# Altium footprint library LDCN Components.PcbLib: 426 footprints (part 24 of 27)
Each footprint in its own frame and in the unit in brackets; x right, y up, seen from the top. Pads: shape width x height; smd on the part's side, far side on the other; paste and mask are expansions set on the pad; w line width, h text height; cw(c..) or ccw(c..) is an arc to the next point about the centre after c.
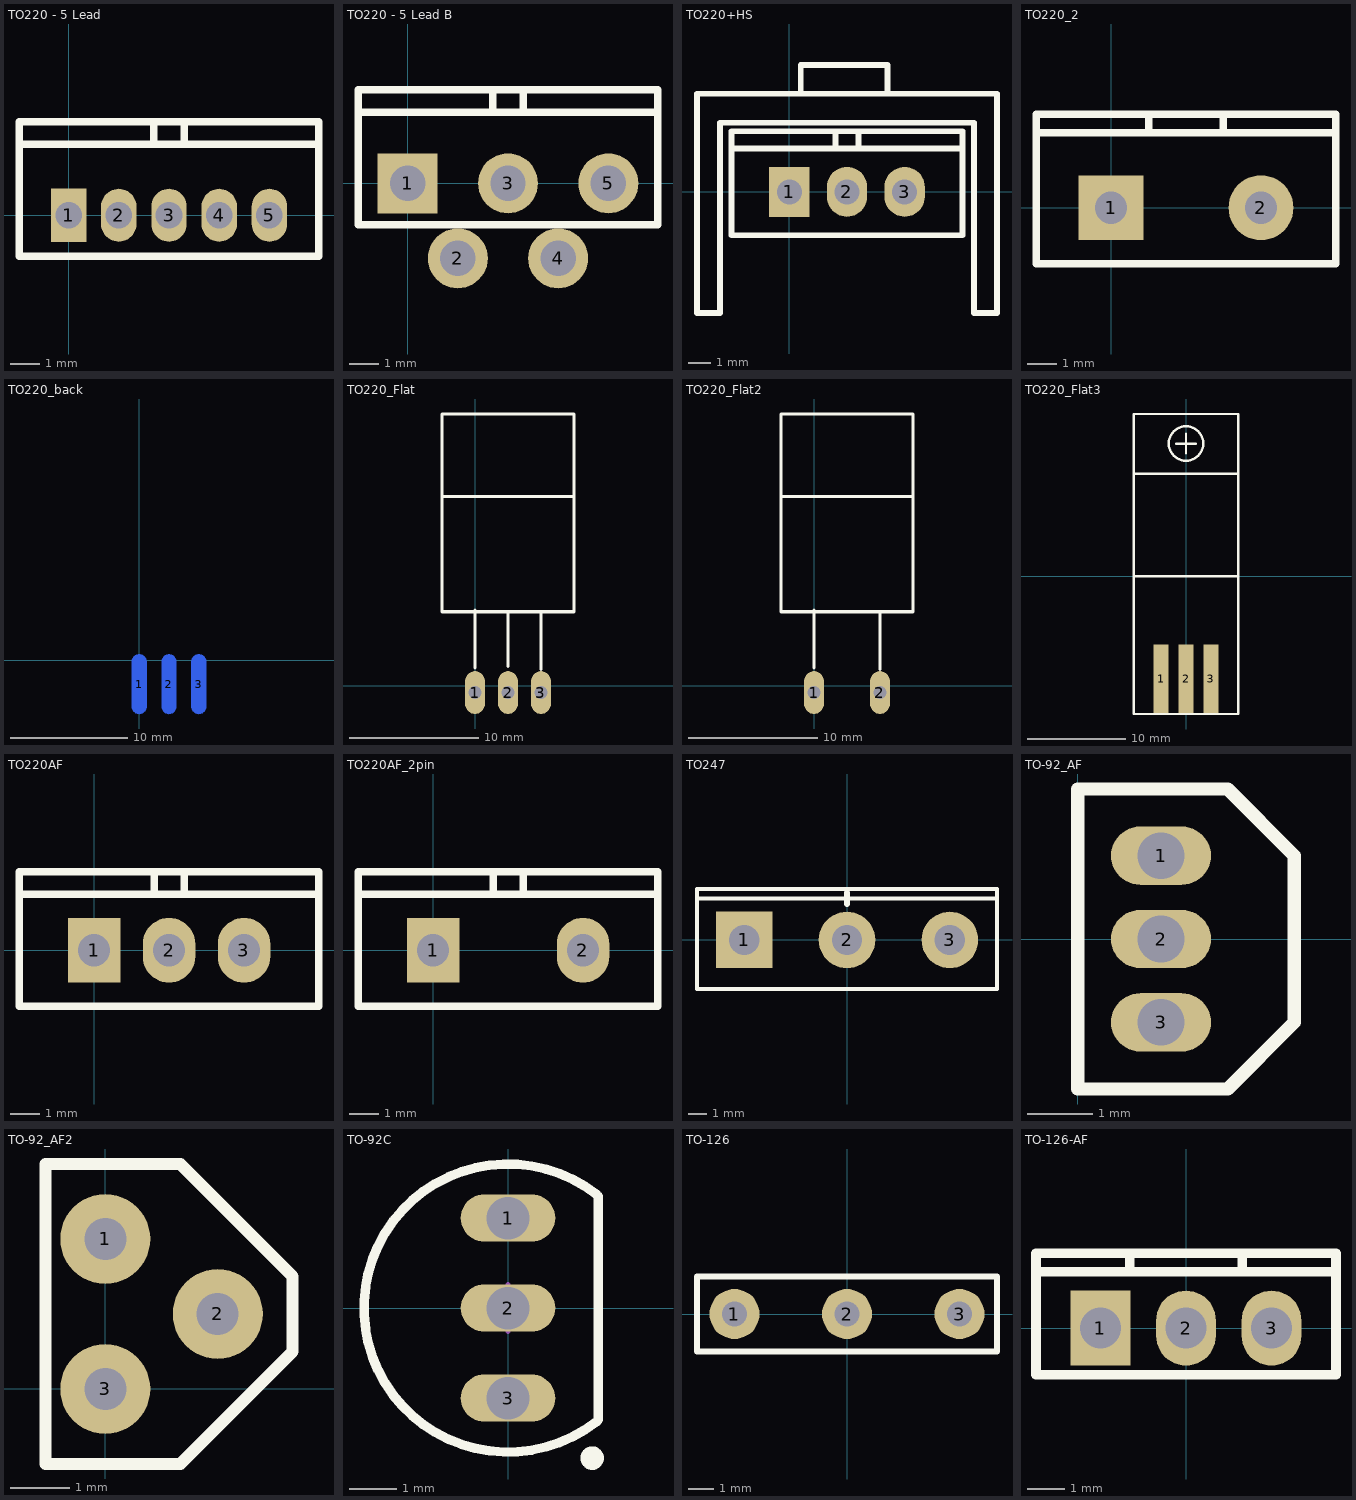
[diagram p23: the footprints below, top view; thin cyan lines are the x and y axes]

## TO220 - 5 Lead [mm] "T0-220 with 5 leads. 0.9mm holes"
pads (5):
  rect 1.2x1.8 hole 0.9: 1(0,0)
  oval 1.2x1.8 hole 0.9: 2(1.7,0) 3(3.4,0) 4(5.1,0) 5(6.8,0)
Top Overlay:
  lines w0.254: -1.553,2.413 8.48,2.413 ; 2.892,2.413 2.892,3.048 ; 3.908,2.413 3.908,3.048 ; -1.68,-1.397 8.48,-1.397 8.48,3.175 -1.68,3.175 -1.68,-1.397

## TO220 - 5 Lead B [mil] "T0-220 with 5 leads"
pads (5):
  rect 80x80 hole 47.24: 1(0,0)
  round 80 hole 47.24: 2(66.93,-100) 3(133.86,0) 4(200.79,-100) 5(267.72,0)
Top Overlay:
  lines w10: -61.14,95 333.86,95 ; 113.86,95 113.86,120 ; 153.86,95 153.86,120 ; -66.14,-55 333.86,-55 333.86,125 -66.14,125 -66.14,-55

## TO220+HS [mm] "T0-220 + Aavid 577102"
height 19
pads (3):
  rect 1.778x2.2 hole 1.1: 1(0,0)
  oval 1.778x2.2 hole 1.1: 2(2.54,0) 3(5.08,0)
Top Overlay:
  lines w0.254: -2.413,1.905 7.62,1.905 ; 0.508,4.318 0.508,5.588 4.318,5.588 4.318,4.318 ; 2.032,1.905 2.032,2.54 ; 3.048,1.905 3.048,2.54 ; -4.064,-5.334 -4.064,4.318 9.144,4.318 9.144,-5.334 8.128,-5.334 8.128,3.048 2.54,3.048 -3.048,3.048 -3.048,-5.334 -4.064,-5.334 ; -2.54,-1.905 -2.54,2.667 7.62,2.667 7.62,-1.905 -2.54,-1.905

## TO220_2 [mm]
pads (2):
  rect 2.2x2.2 hole 1.1: 1(0,0)
  round 2.2 hole 1.1: 2(5.08,0)
Top Overlay:
  lines w0.254: -2.54,2.54 7.62,2.54 ; 1.27,2.54 1.27,3.175 ; 3.81,2.54 3.81,3.175 ; -2.54,-1.905 7.62,-1.905 7.62,3.175 -2.54,3.175 -2.54,-1.905

## TO220_back [mil]
pads (3):
  oval 50x200 smd far side: 1(0,-80) 2(100,-80) 3(200,-80)
Bottom Overlay:
  lines w10: -100,575 300,575 ; 0,55 0,230 ; 100,60 100,225 ; 200,50 200,225 ; -100,225 -100,825 300,825 300,225 -100,225

## TO220_Flat [mil]
pads (3):
  oval 60x130 hole 40: 1(0,-20) 2(100,-20) 3(200,-20)
Top Overlay:
  lines w10: -100,575 300,575 ; 0,55 0,230 ; 100,60 100,225 ; 200,50 200,225 ; -100,225 -100,825 300,825 300,225 -100,225

## TO220_Flat2 [mil]
pads (2):
  oval 60x130 hole 40: 1(0,-20) 2(200,-20)
Top Overlay:
  lines w10: -100,575 300,575 ; 0,55 0,230 ; 200,50 200,225 ; -100,225 300,225 300,825 -100,825 -100,225

## TO220_Flat3 [mm]
pads (3):
  rect 1.5x7 smd: 1(-2.54,-10.414) 2(0,-10.414) 3(2.54,-10.414)
Top Overlay:
  circle w0.254: c0,13.5 r1.75
  lines w0.254: -5.3,10.43 5.3,10.43 ; -1,13.5 1,13.5 ; 0,12.5 0,14.5 ; -5.3,0 -5.3,-14 5.3,-14 5.3,0 ; -5.3,0 5.3,0 ; -5.3,0 -5.3,16.5 5.3,16.5 5.3,0

## TO220AF [mm] "Standard T0-220"
pads (3):
  rect 1.778x2.2 hole 1.1: 1(0,0)
  oval 1.778x2.2 hole 1.1: 2(2.54,0) 3(5.08,0)
Top Overlay:
  lines w0.254: -2.413,1.905 7.62,1.905 ; 2.032,1.905 2.032,2.54 ; 3.048,1.905 3.048,2.54 ; -2.54,-1.905 -2.54,2.667 7.62,2.667 7.62,-1.905 -2.54,-1.905

## TO220AF_2pin [mm] "Two Pin T0-220"
pads (2):
  rect 1.778x2.2 hole 1.1: 1(0,0)
  oval 1.778x2.2 hole 1.1: 2(5.08,0)
Top Overlay:
  lines w0.254: -2.413,1.905 7.62,1.905 ; 2.032,1.905 2.032,2.54 ; 3.048,1.905 3.048,2.54 ; -2.54,-1.905 7.62,-1.905 7.62,2.667 -2.54,2.667 -2.54,-1.905

## TO247 [mm] "SIP with Mounting Hole; 3 Leads; Body 20 x 15.6 x 5 mm (typ); Pitch 5.45 mm"
height 24.5
pads (3):
  rect 3x3 hole 1.6: 1(-5.45,0)
  round 3 hole 1.6: 2(0,0) 3(5.45,0)
Top Overlay:
  lines w0.2: -7.95,2.2 7.95,2.2 ; -7.95,-2.6 7.95,-2.6 7.95,2.7 -7.95,2.7 -7.95,-2.6
  lines w0.305: 0,1.9 0,2.5

## TO-92_AF [mil]
pads (3):
  oval 60x35 hole 28: 1(50,50) 2(50,0) 3(50,-50)
Top Overlay:
  lines w8: 0,-90 90,-90 130,-50 130,50 90,90 0,90 0,-90

## TO-92_AF2 [mil]
height 393.7
pads (3):
  round 60 hole 28: 1(0,100) 2(75,50) 3(0,0)
Top Overlay:
  lines w8: -40,-50 50,-50 125,25 125,75 50,150 -40,150 -40,-50

## TO-92C [mm] "TO, Flat Index; 3 In-Line, Axial Leads; Body Dia. 4.5mm; Leads 0.51 x 0.48 mm (max)"
height 6.86
pads (3):
  oval 2x1 hole 0.9: 1(0,1.905) 2(0,0) 3(0,-1.905)
Top Overlay:
  circle w0.25: c1.78,-3.175 r0.125
  lines w0.2: 1.877,-2.402 cw(c0,0) 1.877,2.402 ; 1.905,-2.362 1.905,2.362
Mechanical 13:
  lines w0.1: 1.877,-2.402 cw(c0,0) 1.877,2.402 ; 1.905,-2.362 1.905,2.362
Mechanical 15:
  lines w0.1: -0.5,0 0.5,0 ; 0,-0.5 0,0.5

## TO-126 [mm]
pads (3):
  round 2 hole 1: 1(-4.5,0) 2(0,0) 3(4.5,0)
Top Overlay:
  lines w0.254: -6,-1.5 6,-1.5 6,1.5 -6,1.5 -6,-1.5

## TO-126-AF [mm] "TO-126"
pads (3):
  rect 1.6x2 hole 1.1: 1(-2.28,0)
  oval 1.6x2 hole 1.1: 2(0,0) 3(2.28,0)
Top Overlay:
  lines w0.254: -4,1.5 4,1.5 ; -1.5,1.5 -1.5,2 ; 1.5,1.5 1.5,2 ; -4,-1.25 4,-1.25 4,2 -4,2 -4,-1.25